# Altium footprint library USB-V11.PcbLib: 36 footprints (part 2 of 3)
Each footprint in its own frame and in the unit in brackets; x right, y up, seen from the top. Pads: shape width x height; smd on the part's side, far side on the other; paste and mask are expansions set on the pad; w line width, h text height; cw(c..) or ccw(c..) is an arc to the next point about the centre after c.
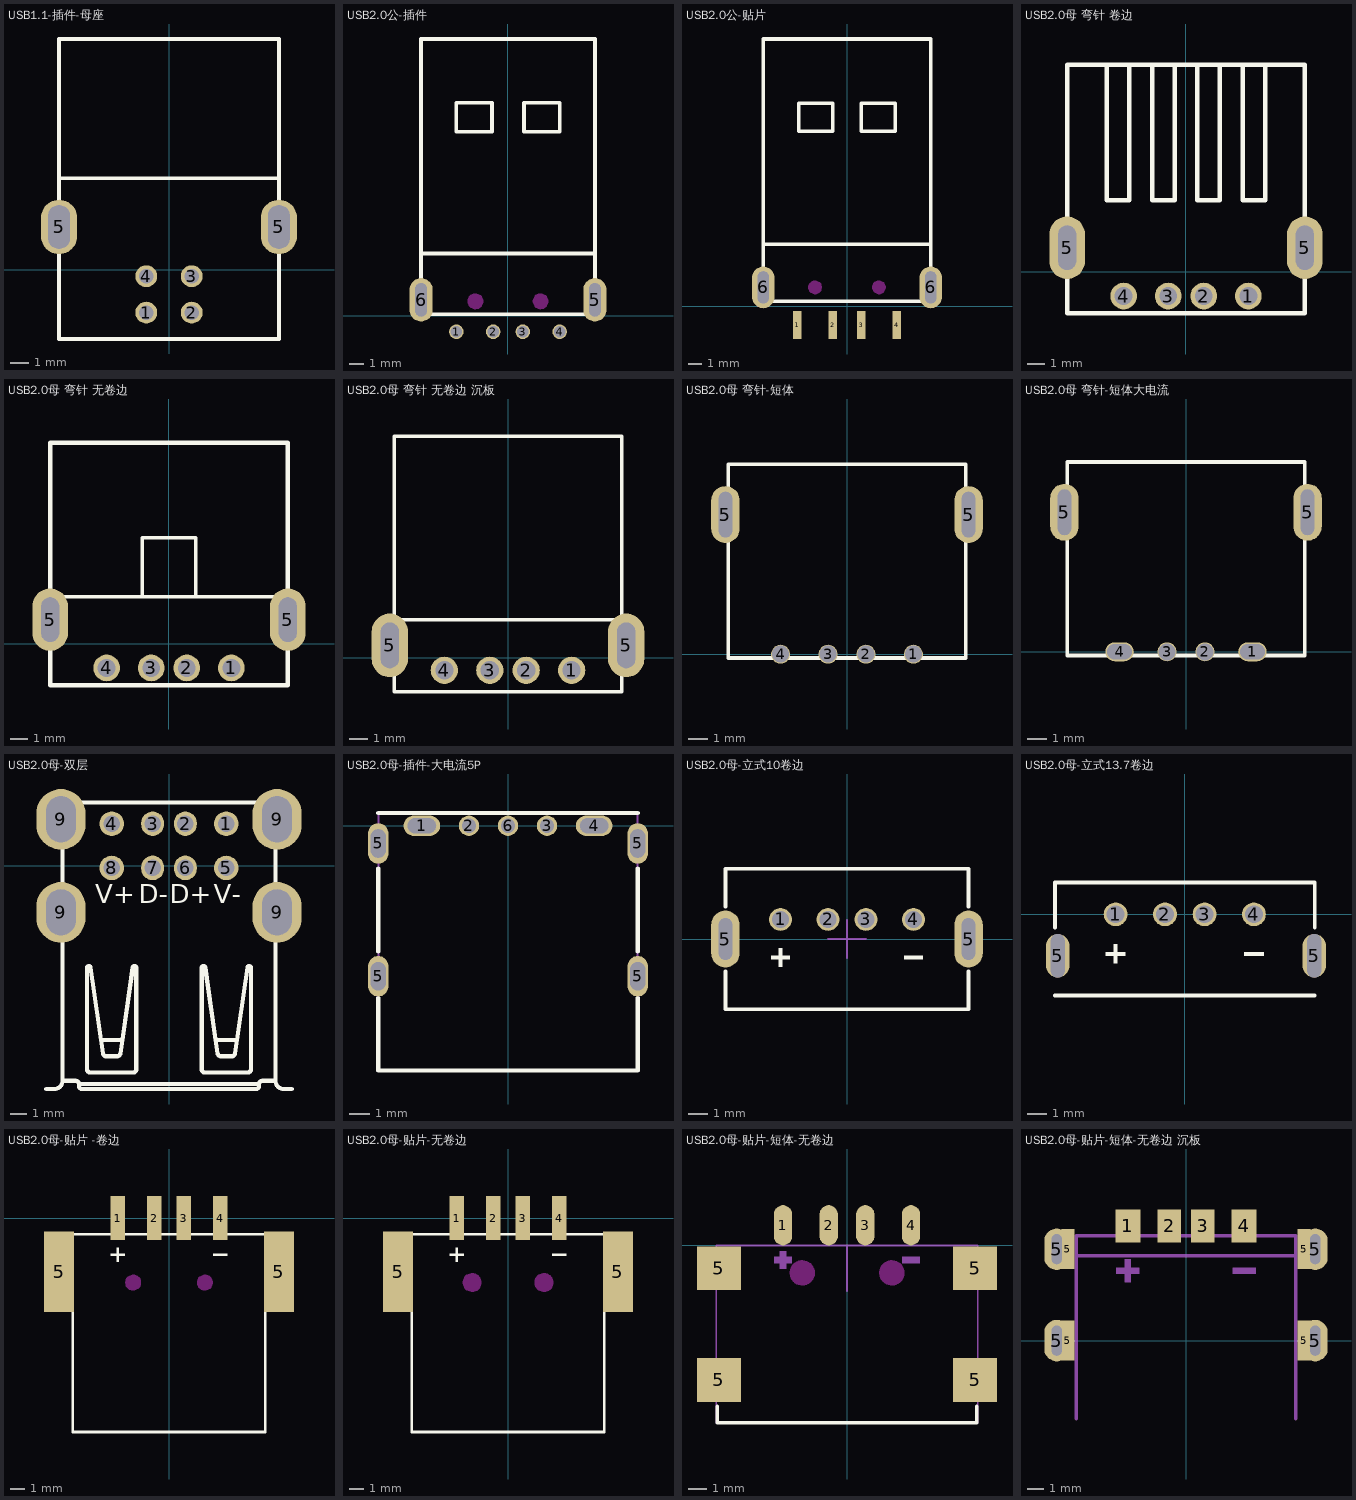
[diagram p1: the footprints below, top view; thin cyan lines are the x and y axes]

## USB1.1-插件-母座 [mm]
pads (6):
  round 1.2 / inner round 1.2 / far side round 1.5 hole 0.8: 1(-1.25,-2.355) 2(1.25,-2.355) 3(1.25,-0.355) 4(-1.25,-0.355)
  oval 2x3 / inner oval 2x3 / far side oval 2.5x3.5 hole 1.2 slot 2.4 at 90 deg: 5(-6.05,2.355) 5(6.05,2.355)
Top Overlay:
  lines w0.2: -6.05,5.045 6.05,5.045 ; -6.05,-3.81 -6.05,12.7 6.05,12.7 6.05,-3.81 -6.05,-3.81
3D body "USB-B DIP.STEP": height 11.2, standoff -3.44, extent -7.399,-3.81 7.399,12.69

## USB2.0公-插件 [mm]
pads (6):
  round 1 / inner round 1.5 / far side round 1.5 hole 0.8: 1(-3.56,-1.1) 2(-1.02,-1.1) 3(1.02,-1.1) 4(3.56,-1.1)
  oval 1.6x3 hole 0.8 slot 2.3 at 90 deg: 5(6,1.1) 6(-6,1.1)
Top Overlay:
  lines w0.254: -6,4.3 6,4.3 ; -6,0.1 6,0.1 6,19.1 -6,19.1 -6,0.1 ; -3.56,12.7 -1.11,12.7 -1.11,14.7 -3.56,14.7 -3.56,12.7 ; 1.11,12.7 1.11,14.7 3.56,14.7 3.56,12.7 1.11,12.7
Keep-Out Layer:
  circle w0.1: c-2.25,1 r0.5
  circle w0.1: c2.25,1 r0.5
  board cut-out: 2.25,0.5 2.151,0.5 1.967,0.576 1.826,0.717 1.75,0.901 1.75,1 1.75,1.099 1.826,1.283 1.967,1.424 2.151,1.5 2.25,1.5 2.349,1.5 2.533,1.424 2.674,1.283 2.75,1.099 2.75,1 2.75,0.901 2.674,0.717 2.533,0.576 2.349,0.5
  board cut-out: -2.25,0.5 -2.349,0.5 -2.533,0.576 -2.674,0.717 -2.75,0.901 -2.75,1 -2.75,1.099 -2.674,1.283 -2.533,1.424 -2.349,1.5 -2.25,1.5 -2.151,1.5 -1.967,1.424 -1.826,1.283 -1.75,1.099 -1.75,1 -1.75,0.901 -1.826,0.717 -1.967,0.576 -2.151,0.5
3D body "USB-AM-S-F-B-TH.STEP": height 3.22, standoff -2.48, extent -6.25,-1.143 6.25,18.887

## USB2.0公-贴片 [mm]
pads (6):
  rect 0.6x2 smd: 1(-3.56,-1.35) 2(-1.02,-1.35) 3(1.02,-1.35) 4(3.56,-1.35)
  oval 1.6x3 hole 0.8 slot 2.3 at 90 deg: 6(-6,1.35) 6(6,1.35)
Top Overlay:
  lines w0.254: -6,4.45 6,4.45 ; -6,0.35 -6,19.15 6,19.15 6,0.35 -6,0.35 ; -3.47,12.55 -1.02,12.55 -1.02,14.55 -3.47,14.55 -3.47,12.55 ; 1.02,12.55 1.02,14.55 3.47,14.55 3.47,12.55 1.02,12.55
Keep-Out Layer:
  circle w0.1: c2.29,1.35 r0.45
  circle w0.1: c-2.29,1.35 r0.45
  board cut-out: -2.74,1.35 -2.74,1.26 -2.671,1.095 -2.545,0.969 -2.38,0.9 -2.29,0.9 -2.2,0.9 -2.035,0.969 -1.909,1.095 -1.84,1.26 -1.84,1.35 -1.84,1.44 -1.909,1.605 -2.035,1.731 -2.2,1.8 -2.29,1.8 -2.38,1.8 -2.545,1.731 -2.671,1.605 -2.74,1.44
  board cut-out: 1.84,1.35 1.84,1.26 1.909,1.095 2.035,0.969 2.2,0.9 2.29,0.9 2.38,0.9 2.545,0.969 2.671,1.095 2.74,1.26 2.74,1.35 2.74,1.44 2.671,1.605 2.545,1.731 2.38,1.8 2.29,1.8 2.2,1.8 2.035,1.731 1.909,1.605 1.84,1.44
3D body "USB Series A .STEP": height 4.5, standoff 0, extent -6,0.381 6,18.711

## USB2.0母 弯针 卷边 [mm]
pads (6):
  round 1.5 hole 1: 1(3.5,-1.355) 2(1,-1.355) 3(-1,-1.355) 4(-3.5,-1.355)
  oval 2x3.5 hole 1 slot 2.5 at 90 deg: 5(-6.667,1.355) 5(6.668,1.355)
Top Overlay:
  lines w0.254: -4.445,11.635 -4.445,4.015 -3.175,4.015 -3.175,11.635 ; -1.905,11.635 -1.905,4.015 -0.635,4.015 -0.635,11.635 ; 0.635,11.635 0.635,4.015 1.905,4.015 1.905,11.635 ; 3.175,11.635 3.175,4.015 4.445,4.015 4.445,11.635 ; -6.667,-2.335 -6.667,11.635 6.668,11.635 6.668,-2.335 -6.667,-2.335
3D body "Samtec-USBR-A-S-S-O-TH.STEP": height 7.55, standoff -3.3, extent -7.895,-2.455 7.905,11.705

## USB2.0母 弯针 无卷边 [mm]
pads (6):
  round 1.5 hole 1: 1(3.5,-1.355) 2(1,-1.355) 3(-1,-1.355) 4(-3.5,-1.355)
  oval 2x3.5 hole 1 slot 2.5 at 90 deg: 5(-6.667,1.355) 5(6.668,1.355)
Top Overlay:
  lines w0.2: -6.667,2.645 6.668,2.645 ; -1.5,2.645 -1.5,5.945 1.5,5.945 1.5,2.645
  lines w0.254: -6.667,-2.335 -6.667,11.295 6.668,11.295 6.668,-2.335 -6.667,-2.335
3D body "Samtec-USBR-A-S-S-O-TH.STEP": height 7.55, standoff -3.3, extent -7.895,-2.455 7.905,11.705

## USB2.0母 弯针 无卷边 沉板 [mm]
pads (6):
  round 1.5 hole 1: 1(3.5,-0.685) 2(1,-0.685) 3(-1,-0.685) 4(-3.5,-0.685)
  oval 2x3.5 hole 1 slot 2.5 at 90 deg: 5(-6.5,0.685) 5(6.5,0.685)
Top Overlay:
  lines w0.2: -6.25,2.085 6.25,2.085 ; -6.25,-1.865 6.25,-1.865 6.25,12.185 -6.25,12.185 -6.25,-1.865
3D body "User Library-USB Socket.step": height 4.9, standoff -3.13, extent -7.3,-2.03 7.3,12.2

## USB2.0母 弯针-短体 [mm]
pads (6):
  round 1 / inner round 1.5 / far side round 1.5 hole 0.9: 1(3.5,0) 2(1,0) 3(-1,0) 4(-3.5,0)
  oval 1.5x3 hole 0.7 slot 2.4 at 90 deg: 5(-6.4,7.35) 5(6.4,7.35)
Top Overlay:
  lines w0.2: -6.25,-0.2 -6.25,10 6.25,10 6.25,-0.2 -6.25,-0.2
3D body "614104150121.stp": height 7.26, standoff -1.56, extent -7.3,-0.15 7.3,9.85

## USB2.0母 弯针-短体大电流 [mm]
pads (6):
  oval 1.5x1 / inner oval 2x1.5 / far side oval 2x1.5 hole 0.8 slot 1.3 at 0 deg: 1(3.5,0) 4(-3.5,0)
  round 1 / inner round 1.5 / far side round 1.5 hole 0.9: 2(1,0) 3(-1,0)
  oval 1.5x3 hole 0.7 slot 2.4 at 90 deg: 5(-6.4,7.35) 5(6.4,7.35)
Top Overlay:
  lines w0.2: -6.25,-0.2 -6.25,10 6.25,10 6.25,-0.2 -6.25,-0.2
3D body "614104150121.stp": height 7.26, standoff -1.56, extent -7.3,-0.15 7.3,9.85

## USB2.0母-双层 [mm]
pads (12):
  round 1.5 / inner round 1.5 / far side oval 1.8x2 hole 1: 1(3.5,2.57) 4(-3.5,2.57) 5(3.5,-0.13) 8(-3.5,-0.13)
  oval 1.4x1.5 / inner oval 1.4x1.5 / far side oval 1.4x2 hole 1: 2(1,2.57) 3(-1,2.57) 6(1,-0.13) 7(-1,-0.13)
  oval 3x3.7 hole 1.8 slot 2.8 at 90 deg: 9(-6.6,-2.84) 9(-6.6,2.84) 9(6.6,-2.84) 9(6.6,2.84)
Top Overlay:
  lines w0.254: -7.5,-13.63 -7,-13.63 ccw(c-7,-13.13) -6.5,-13.13 ; -6.5,-4.43 -6.5,-13.13 ; -6.5,-1.43 -6.5,0.37 -6.5,3.87 ; -4.15,-10.63 -2.849,-10.63 ; 2.85,-10.63 4.151,-10.63 ; 6.5,-4.43 6.5,-13.13 ; 6.5,-1.43 6.5,0.37 6.5,3.87 ; 7.5,-13.63 7,-13.63 cw(c7,-13.13) 6.5,-13.13 ; -6.5,-13.13 -5.7,-13.13 cw(c-5.7,-13.33) -5.5,-13.33 ; -6.5,3.87 -6.5,3.87 ; -6.5,3.87 6.5,3.87 ; -5.5,-13.33 5.5,-13.33 ; -5.5,-13.33 -5.5,-13.43 ccw(c-5.3,-13.43) -5.3,-13.63 5.3,-13.63 ccw(c5.3,-13.43) 5.5,-13.43 5.5,-13.33 ; 5.5,-13.33 cw(c5.7,-13.33) 5.7,-13.13 6.5,-13.13 ; 6.5,3.87 6.5,3.87 ; -5,-12.43 ccw(c-4.8,-12.43) -4.8,-12.63 -2.2,-12.63 ccw(c-2.2,-12.43) -2,-12.43 -2,-6.23 ccw(c-2.1,-6.23) -2.1,-6.13 -2.113,-6.13 ccw(c-2.113,-6.23) -2.212,-6.216 -2.97,-11.466 cw(c-3.167,-11.43) -3.167,-11.63 -3.833,-11.63 cw(c-3.833,-11.43) -4.03,-11.466 -4.788,-6.216 ccw(c-4.887,-6.23) -4.887,-6.13 -4.9,-6.13 ccw(c-4.9,-6.23) -5,-6.23 -5,-12.43 ; 2,-12.43 ccw(c2.2,-12.43) 2.2,-12.63 4.8,-12.63 ccw(c4.8,-12.43) 5,-12.43 5,-6.23 ccw(c4.9,-6.23) 4.9,-6.13 4.887,-6.13 ccw(c4.887,-6.23) 4.788,-6.216 4.03,-11.466 cw(c3.833,-11.43) 3.833,-11.63 3.167,-11.63 cw(c3.167,-11.43) 2.97,-11.466 2.212,-6.216 ccw(c2.113,-6.23) 2.113,-6.13 2.1,-6.13 ccw(c2.1,-6.23) 2,-6.23 2,-12.43
  text "V+" at -4.518,-2.685 h2
  text "V-" at 2.721,-2.685 h2
  text "D+" at 0.054,-2.685 h2
  text "D-" at -1.851,-2.685 h2
3D body "User Library-3066-14810001R-Rev_01.STEP": height 16.43, standoff -4.07, extent -7.72,-13.67 7.72,4.696

## USB2.0母-插件-大电流5P [mm]
pads (9):
  oval 1.8x1 / inner oval 1.8x1 / far side oval 2.2x1.4 hole 0.75 slot 1.4 at 0 deg: 1(-4.25,0) 4(4.25,0)
  round 1 / inner round 1 / far side round 1.2 hole 0.7: 2(-1.925,0) 3(1.925,0) 6(0,0)
  oval 1x2 / inner oval 1x2 / far side oval 1.4x2.2 hole 0.75 slot 1.4 at 90 deg: 5(-6.4,-7.425) 5(-6.4,-0.875) 5(6.4,-7.425) 5(6.4,-0.875)
Top Overlay:
  lines w0.2: -6.4,-8.5 -6.4,-12.075 6.4,-12.075 6.4,-8.5 ; -6.4,-6.2 -6.4,-2.1 ; -6.4,0.625 6.4,0.625 ; 6.4,-6.2 6.4,-2.1
Mechanical 15:
  lines w0.1: -6.4,-12.075 -6.4,0.625 6.4,0.625 6.4,-12.075 -6.4,-12.075
  text "DP" at 2.1,1 h0.5
  text "DM" at -1.8,1 h0.5
  text "VBUS" at -4,1 h0.5
  text "GND" at 4.5,1 h0.5

## USB2.0母-立式10卷边 [mm]
pads (6):
  round 1.2 / inner round 1.2 / far side oval 1.5x1.6 hole 0.9: 1(-3.5,1.03) 2(-1,1.03) 3(1,1.03) 4(3.5,1.03)
  oval 1.5x3 hole 0.7 slot 2.2 at 90 deg: 5(-6.4,0) 5(6.4,0)
Top Overlay:
  rectangle: -3.6,-1.47 -3.4,-0.47
  region: -3,-1.07 -3,-0.87 -4,-0.87 -4,-1.07
  region: 4,-1.07 4,-0.87 3,-0.87 3,-1.07
  lines w0.2: -6.4,-1.7 -6.4,-3.7 6.4,-3.7 6.4,-1.7 ; -6.4,1.7 -6.4,3.7 6.4,3.7 6.4,1.7
Mechanical 15:
  lines w0.1: -1,0 1,0 ; 0,-1 0,1
3D body: height 10, standoff 0.1, extent -6.4,-3.7 6.4,3.7

## USB2.0母-立式13.7卷边 [mm]
pads (6):
  round 1.2 / inner round 1.2 / far side oval 1.5x1.6 hole 0.9: 1(-3.5,0) 2(-1,0) 3(1,0) 4(3.5,0)
  oval 1.2x2.2 / inner oval 1.2x2.2 / far side oval 1.5x3 hole 0.7 slot 2.2 at 90 deg: 5(-6.425,-2.1) 5(6.55,-2.1)
Top Overlay:
  rectangle: -3.6,-2.5 -3.4,-1.5
  region: -3,-2.1 -3,-1.9 -4,-1.9 -4,-2.1
  region: 4,-2.1 4,-1.9 3,-1.9 3,-2.1
  lines w0.2: -6.575,-4.1 6.575,-4.1 ; -6.575,-0.675 -6.575,1.6 6.575,1.6 6.575,-0.675
3D body "1734366-3.stp": height 15, standoff -3.93, extent -7.899,-4.86 7.9,2.26

## USB2.0母-贴片 -卷边 [mm]
pads (6):
  rect 1x3 smd: 1(-3.5,0) 2(-1,0) 3(1,0) 4(3.5,0)
  rect 2.05x5.5 smd: 5(-7.5,-3.65) 5(7.5,-3.65)
Top Overlay:
  rectangle: 3,-2.6 4,-2.4
  rectangle: -4,-2.6 -3,-2.4
  region: -3.4,-3 -3.4,-2 -3.6,-2 -3.6,-3
  lines w0.2: -6.575,-14.6 -6.575,-1.1 6.575,-1.1 6.575,-14.6 -6.575,-14.6
Keep-Out Layer:
  circle w0.1: c-2.45,-4.4 r0.5
  circle w0.1: c2.45,-4.4 r0.5
  board cut-out: 1.95,-4.4 1.95,-4.499 2.026,-4.683 2.167,-4.824 2.351,-4.9 2.45,-4.9 2.549,-4.9 2.733,-4.824 2.874,-4.683 2.95,-4.499 2.95,-4.4 2.95,-4.301 2.874,-4.117 2.733,-3.976 2.549,-3.9 2.45,-3.9 2.351,-3.9 2.167,-3.976 2.026,-4.117 1.95,-4.301
  board cut-out: -1.95,-4.4 -1.95,-4.499 -2.026,-4.683 -2.167,-4.824 -2.351,-4.9 -2.45,-4.9 -2.549,-4.9 -2.733,-4.824 -2.874,-4.683 -2.95,-4.499 -2.95,-4.4 -2.95,-4.301 -2.874,-4.117 -2.733,-3.976 -2.549,-3.9 -2.45,-3.9 -2.351,-3.9 -2.167,-3.976 -2.026,-4.117 -1.95,-4.301
3D body "User Library-USB1045-XX-L-X-A_revA.step": height 7.9, standoff -0.3, extent -7.55,-14.6 7.55,0.5

## USB2.0母-贴片-无卷边 [mm]
pads (6):
  rect 1x3 smd: 1(-3.5,0) 2(-1,0) 3(1,0) 4(3.5,0)
  rect 2.05x5.5 smd: 5(-7.5,-3.65) 5(7.5,-3.65)
Top Overlay:
  region: -3.4,-3 -3.4,-2 -3.6,-2 -3.6,-3
  rectangle: -4,-2.6 -3,-2.4
  rectangle: 3,-2.6 4,-2.4
  lines w0.2: -6.575,-14.6 6.575,-14.6 6.575,-1.1 -6.575,-1.1 -6.575,-14.6
Keep-Out Layer:
  circle w0.1: c-2.45,-4.4 r0.6
  circle w0.1: c2.45,-4.4 r0.6
  board cut-out: 1.85,-4.4 1.85,-4.519 1.941,-4.74 2.11,-4.909 2.331,-5 2.45,-5 2.569,-5 2.79,-4.909 2.959,-4.74 3.05,-4.519 3.05,-4.4 3.05,-4.281 2.959,-4.06 2.79,-3.891 2.569,-3.8 2.45,-3.8 2.331,-3.8 2.11,-3.891 1.941,-4.06 1.85,-4.281
  board cut-out: -3.05,-4.4 -3.05,-4.519 -2.959,-4.74 -2.79,-4.909 -2.569,-5 -2.45,-5 -2.331,-5 -2.11,-4.909 -1.941,-4.74 -1.85,-4.519 -1.85,-4.4 -1.85,-4.281 -1.941,-4.06 -2.11,-3.891 -2.331,-3.8 -2.45,-3.8 -2.569,-3.8 -2.79,-3.891 -2.959,-4.06 -3.05,-4.281
3D body "User Library-USB1045-XX-L-X-A_revA.step": height 7.65, standoff -0.55, extent -7.55,-14.7 7.55,0.4

## USB2.0母-贴片-短体-无卷边 [mm]
pads (8):
  oval 1x2.2 smd: 1(-3.5,1.1) 2(-1,1.1) 3(1,1.1) 4(3.5,1.1)
  rect 2.4x2.4 smd: 5(-7,-7.35) 5(-7,-1.25) 5(7,-7.35) 5(7,-1.25)
Top Overlay:
  lines w0.2: -7.1,-8.8 -7.1,-9.7 7.1,-9.7 7.1,-8.8
Keep-Out Layer:
  circle w0.1: c-2.45,-1.5 r0.65
  circle w0.1: c2.45,-1.5 r0.65
  board cut-out: -3.1,-1.5 -3.1,-1.564 -3.075,-1.69 -3.026,-1.808 -2.955,-1.914 -2.864,-2.005 -2.758,-2.076 -2.64,-2.125 -2.514,-2.15 -2.45,-2.15 -2.386,-2.15 -2.26,-2.125 -2.142,-2.076 -2.036,-2.005 -1.945,-1.914 -1.874,-1.808 -1.825,-1.69 -1.8,-1.564 -1.8,-1.5 -1.8,-1.436 -1.825,-1.31 -1.874,-1.192 -1.945,-1.086 -2.036,-0.995 -2.142,-0.924 -2.26,-0.875 -2.386,-0.85 -2.45,-0.85 -2.514,-0.85 -2.64,-0.875 -2.758,-0.924 -2.864,-0.995 -2.955,-1.086 -3.026,-1.192 -3.075,-1.31 -3.1,-1.436
  board cut-out: 1.8,-1.5 1.8,-1.564 1.825,-1.69 1.874,-1.808 1.945,-1.914 2.036,-2.005 2.142,-2.076 2.26,-2.125 2.386,-2.15 2.45,-2.15 2.514,-2.15 2.64,-2.125 2.758,-2.076 2.864,-2.005 2.955,-1.914 3.026,-1.808 3.075,-1.69 3.1,-1.564 3.1,-1.5 3.1,-1.436 3.075,-1.31 3.026,-1.192 2.955,-1.086 2.864,-0.995 2.758,-0.924 2.64,-0.875 2.514,-0.85 2.45,-0.85 2.386,-0.85 2.26,-0.875 2.142,-0.924 2.036,-0.995 1.945,-1.086 1.874,-1.192 1.825,-1.31 1.8,-1.436
Mechanical 15:
  rectangle: 3,-1 4,-0.6
  region: -3.3,-1.3 -3.3,-0.3 -3.7,-0.3 -3.7,-1.3
  rectangle: -4,-1 -3,-0.6
  lines w0.1: 0,-2.5 0,0 ; -7.15,-9.7 -7.15,0 7.15,0 7.15,-9.7 -7.15,-9.7
3D body "User Library-USB1045-XX-L-X-A_revA.step": height 7.65, standoff -0.55, extent -7.55,-9.7 7.55,5.4

## USB2.0母-贴片-短体-无卷边 沉板 [mm]
pads (12):
  rect 1.5x2 smd: 1(-3.5,6.9) 4(3.5,6.9)
  rect 1.4x2 smd: 2(-1,6.9) 3(1,6.9)
  oval 1.5x2.5 hole 0.6 slot 1.8 at 90 deg: 5(-7.775,0) 5(-7.775,5.5) 5(7.775,0) 5(7.775,5.5)
  rect 0.8x2.4 smd: 5(-7.1,0) 5(-7.1,5.5) 5(7.1,0) 5(7.1,5.5)
Top Paste:
  region: 8,6.715 8.114,6.68 8.309,6.54 8.45,6.347 8.525,6.12 8.525,6 8.525,5.5 8.075,5.5 8.075,6.1 8.074,6.127 8.064,6.18 8.045,6.231 8.017,6.277 8,6.298
  region: 8,4.285 8.114,4.32 8.309,4.46 8.45,4.653 8.525,4.88 8.525,5 8.525,5.5 8.075,5.5 8.075,4.9 8.074,4.873 8.064,4.82 8.045,4.769 8.017,4.723 8,4.702
  region: 8,1.215 8.114,1.18 8.309,1.04 8.45,0.847 8.525,0.62 8.525,0.5 8.525,0 8.075,0 8.075,0.6 8.074,0.627 8.064,0.68 8.045,0.731 8.017,0.777 8,0.798
  region: 8,-1.215 8.114,-1.18 8.309,-1.04 8.45,-0.847 8.525,-0.62 8.525,-0.5 8.525,0 8.075,0 8.075,-0.6 8.074,-0.627 8.064,-0.68 8.045,-0.731 8.017,-0.777 8,-0.798
  region: -8,1.215 -8.114,1.18 -8.309,1.04 -8.45,0.847 -8.525,0.62 -8.525,0.5 -8.525,0 -8.075,0 -8.075,0.6 -8.074,0.627 -8.064,0.68 -8.045,0.731 -8.017,0.777 -8,0.798
  region: -8,-1.215 -8.114,-1.18 -8.309,-1.04 -8.45,-0.847 -8.525,-0.62 -8.525,-0.5 -8.525,0 -8.075,0 -8.075,-0.6 -8.074,-0.627 -8.064,-0.68 -8.045,-0.731 -8.017,-0.777 -8,-0.798
  region: -8,4.285 -8.114,4.32 -8.309,4.46 -8.45,4.653 -8.525,4.88 -8.525,5 -8.525,5.5 -8.075,5.5 -8.075,4.9 -8.074,4.873 -8.064,4.82 -8.045,4.769 -8.017,4.723 -8,4.702
  region: -8,6.715 -8.114,6.68 -8.309,6.54 -8.45,6.347 -8.525,6.12 -8.525,6 -8.525,5.5 -8.075,5.5 -8.075,6.1 -8.074,6.127 -8.064,6.18 -8.045,6.231 -8.017,6.277 -8,6.298
Mechanical 15:
  region: 4.2,4 4.2,4.4 2.8,4.4 2.8,4
  region: -2.8,4 -2.8,4.4 -4.2,4.4 -4.2,4
  rectangle: -3.7,3.5 -3.3,4.9
  lines w0.2: -6.6,-4.7 -6.6,6.3 6.6,6.3 6.6,-4.7 ; -6.6,5.1 6.6,5.1